# Altium schematic symbol library IC_TI.SCHLIB: 1162 symbols (part 5 of 8) (continued)
## SN74HC377DW
designator U?
Integrated Circuit; Manufacturer_Name: Texas Instruments; Manufacturer_Part_Number: SN74HC377DW; Datasheet Link: http://www.ti.com/lit/ds/symlink/sn74hc377.pdf; Height: 2.65mm; Mouser Part Number: 595-SN74HC377DW; Mouser Price/Stock: https://www.mouser.com/Search/ProductDetail.aspx?qs=5h8QSfodyRiIk4tvBRkKnA%3d%3d; RS Part Number: 6632094; RS Price/Stock: http://uk.rs-online.com/web/p/flip-flop-ics/6632094/?source=DS
footprint SOIC20W_1.27
pins: 1 ~{CLKEN} (in), 2 1Q (out), 3 1D (in), 4 2D (in), 5 2Q (out), 6 3Q (out), 7 3D (in), 8 4D (in), 9 4Q (out), 10 GND (power), 11 CLK (in), 12 5Q (out), 13 5D (in), 14 6D (in), 15 6Q (out), 16 7Q (out), 17 7D (in), 18 8D (in), 19 8Q (out), 20 VCC (power)

## SN74HC377N
designator U?
Integrated Circuit; Manufacturer_Name: Texas Instruments; Manufacturer_Part_Number: SN74HC377N; Datasheet Link: http://www.ti.com/lit/gpn/sn74hc377; Mouser Part Number: 595-SN74HC377N; Mouser Price/Stock: https://www.mouser.com/Search/Refine.aspx?Keyword=595-SN74HC377N; RS Part Number: 3333195; RS Price/Stock: http://uk.rs-online.com/web/p/products/3333195
footprint DIP20
pins: 1 ~CLKEN, 2 1Q, 3 1D, 4 2D, 5 2Q, 6 3Q, 7 3D, 8 4D, 9 4Q, 10 GND, 11 CLK, 12 5Q, 13 5D, 14 6D, 15 6Q, 16 7Q, 17 7D, 18 8D, 19 8Q, 20 VCC

## SN74HC393D
designator U?
Integrated Circuit; Manufacturer_Name: Texas Instruments; Manufacturer_Part_Number: SN74HC393D; Datasheet Link: http://www.ti.com/lit/ds/symlink/sn74hc393.pdf; Height: 1.75mm; Mouser Part Number: 595-SN74HC393D; Mouser Price/Stock: https://www.mouser.com/Search/Refine.aspx?Keyword=595-SN74HC393D; RS Part Number: 1450173; RS Price/Stock: http://uk.rs-online.com/web/p/products/1450173
footprint SOIC14_1.27
pins: 1 1CLK (in), 2 1CLR, 3 1QA, 4 1QB, 5 1QC, 6 1QD, 7 GND (power), 8 2QD, 9 2QC, 10 2QB, 11 2QA, 12 2CLR, 13 2CLK (in), 14 VCC (power)

## SN74HC393NE4
designator U?
Integrated Circuit; Manufacturer_Name: Texas Instruments; Manufacturer_Part_Number: SN74HC393NE4; Datasheet Link: http://www.ti.com/lit/ds/scls143d/scls143d.pdf; Height: 5.08mm; Mouser Part Number: 595-SN74HC393NE4; Mouser Price/Stock: https://www.mouser.com/Search/ProductDetail.aspx?qs=AgY10sKTvDJsJVsODo2UiQ%3d%3d; RS Part Number: 7092012; RS Price/Stock: http://uk.rs-online.com/web/p/products/7092012
footprint DIP14-A
pins: 1 1CLK, 2 1CLR, 3 1QA, 4 1QB, 5 1QC, 6 1QD, 7 GND, 8 2QD, 9 2QC, 10 2QB, 11 2QA, 12 2CLR, 13 2CLK, 14 VCC

## SN74HC393PW
designator U?
Integrated Circuit; Manufacturer_Name: Texas Instruments; Manufacturer_Part_Number: SN74HC393PW; Mouser Part Number: 595-SN74HC393PW
footprint TSSOP14_0.65 (TSOP, 14-Leads, Body 5.00x4.40mm, Pitch 0.65mm, Thermal Pad 2.31x2.46mm, IPC Low Density)
pins: 1 1CLK, 2 1CLR, 3 1QA, 4 1QB, 5 1QC, 6 1QD, 7 GND, 8 2QD, 9 2QC, 10 2QB, 11 2QA, 12 2CLR, 13 2CLK, 14 VCC

## SN74HC541DWR
designator U?
Integrated Circuit; Manufacturer_Name: Texas Instruments; Manufacturer_Part_Number: SN74HC541DWR; Datasheet Link: http://www.ti.com/lit/ds/symlink/sn74hc541.pdf; Height: 2.65mm; Mouser Part Number: 595-SN74HC541DWR; Mouser Price/Stock: https://www.mouser.com/Search/Refine.aspx?Keyword=595-SN74HC541DWR; RS Part Number: 0528533; RS Price/Stock: http://uk.rs-online.com/web/p/products/0528533
footprint SOIC20W_1.27
pins: 1 ~{OE1}, 2 A1, 3 A2, 4 A3, 5 A4, 6 A5, 7 A6, 8 A7, 9 A8, 10 GND (power), 11 Y8, 12 Y7, 13 Y6, 14 Y5, 15 Y4, 16 Y3, 17 Y2, 18 Y1, 19 ~{OE2}, 20 VCC (power)

## SN74HC541NSR
designator U?
Integrated Circuit; Manufacturer_Name: Texas Instruments; Manufacturer_Part_Number: SN74HC541NSR; Datasheet Link: http://www.ti.com/lit/gpn/sn74hc541; Height: 2mm; Mouser Part Number: 595-SN74HC541NSR; Mouser Price/Stock: https://www.mouser.com/Search/Refine.aspx?Keyword=595-SN74HC541NSR
footprint SOP20W_1.27
pins: 1 ~{OE1}, 2 A1, 3 A2, 4 A3, 5 A4, 6 A5, 7 A6, 8 A7, 9 A8, 10 GND, 11 Y8, 12 Y7, 13 Y6, 14 Y5, 15 Y4, 16 Y3, 17 Y2, 18 Y1, 19 ~{OE2}, 20 VCC

## SN74HC541PWR
designator U?
Integrated Circuit; Manufacturer_Name: Texas Instruments; Manufacturer_Part_Number: SN74HC541PWR; Datasheet Link: http://www.ti.com/lit/gpn/sn74hc541; Height: 1.2mm; Mouser Part Number: 595-SN74HC541PWR; Mouser Price/Stock: https://www.mouser.com/Search/Refine.aspx?Keyword=595-SN74HC541PWR; RS Part Number: 1624289; RS Price/Stock: http://uk.rs-online.com/web/p/products/1624289
footprint TSSOP20_0.65 (TSOP, 20-Leads, Body 6.6x4.5mm (max), Pitch 0.65mm, IPC Medium Density)
pins: 1 ~{OE1}, 2 A1, 3 A2, 4 A3, 5 A4, 6 A5, 7 A6, 8 A7, 9 A8, 10 GND, 11 Y8, 12 Y7, 13 Y6, 14 Y5, 15 Y4, 16 Y3, 17 Y2, 18 Y1, 19 ~{OE2}, 20 VCC

## SN74HC573ADW
designator U?
Integrated Circuit; Manufacturer_Name: Texas Instruments; Manufacturer_Part_Number: SN74HC573ADW; Datasheet Link: http://www.ti.com/lit/gpn/sn74hc573a; Mouser Part Number: 595-SN74HC573ADW; Mouser Price/Stock: https://www.mouser.com/Search/Refine.aspx?Keyword=595-SN74HC573ADW; RS Part Number: 6632133P; RS Price/Stock: http://uk.rs-online.com/web/p/products/6632133P
footprint SOIC20W_1.27
pins: 1 ~OE, 2 1D, 3 2D, 4 3D, 5 4D, 6 5D, 7 6D, 8 7D, 9 8D, 10 GND, 11 LE, 12 8Q, 13 7Q, 14 6Q, 15 5Q, 16 4Q, 17 3Q, 18 2Q, 19 1Q, 20 VCC

## SN74HC574DWRG4
designator U?
Integrated Circuit; Manufacturer_Name: Texas Instruments; Manufacturer_Part_Number: SN74HC574DWRG4; Datasheet Link: http://docs-emea.rs-online.com/webdocs/0b83/0900766b80b83bcf.pdf; Height: 2.65mm; RS Part Number: 0526280; RS Price/Stock: http://uk.rs-online.com/web/p/products/0526280
footprint SOIC20W_1.27
pins: 1 ~{OE}, 2 1D, 3 2D, 4 3D, 5 4D, 6 5D, 7 6D, 8 7D, 9 8D, 10 GND (power), 11 CLK (in), 12 8Q, 13 7Q, 14 6Q, 15 5Q, 16 4Q, 17 3Q, 18 2Q, 19 1Q, 20 VCC (power)

## SN74HC594D
designator U?
Integrated Circuit; Manufacturer_Name: Texas Instruments; Manufacturer_Part_Number: SN74HC594D; Datasheet Link: http://www.ti.com/lit/ds/symlink/sn74hc594.pdf; Height: 1.75mm; Mouser Part Number: 595-SN74HC594D; Mouser Price/Stock: https://www.mouser.com/Search/Refine.aspx?Keyword=595-SN74HC594D; RS Part Number: 6632158P; RS Price/Stock: http://uk.rs-online.com/web/p/products/6632158P
footprint SOIC16_1.27
pins: 1 QB, 2 QC, 3 QD, 4 QE, 5 QF, 6 QG, 7 QH, 8 GND (power), 9 QHINVERTED (in), 10 ~{SRCLR}, 11 SRCLR, 12 RCLK (in), 13 ~{RCLK} (in), 14 SER, 15 QA, 16 VCC (power)

## SN74HC594DW
designator U?
Integrated Circuit; Manufacturer_Name: Texas Instruments; Manufacturer_Part_Number: SN74HC594DW; Datasheet Link: http://www.ti.com/lit/gpn/sn74hc594; Mouser Part Number: 595-SN74HC594DW; Mouser Price/Stock: https://www.mouser.com/Search/Refine.aspx?Keyword=595-SN74HC594DW; RS Part Number: 6632151P; RS Price/Stock: http://uk.rs-online.com/web/p/products/6632151P
footprint SOIC16W_1.27
pins: 1 QB, 2 QC, 3 QD, 4 QE, 5 QF, 6 QG, 7 QH, 8 GND, 9 QH_2, 10 ~SRCLR, 11 SRCLK, 12 RCLK, 13 ~RCLR, 14 SER, 15 QA, 16 VCC

## SN74HC594N
designator U?
Integrated Circuit; Manufacturer_Name: Texas Instruments; Manufacturer_Part_Number: SN74HC594N; Datasheet Link: http://www.ti.com/lit/gpn/sn74hc594; Mouser Part Number: 595-SN74HC594N; Mouser Price/Stock: https://www.mouser.com/Search/Refine.aspx?Keyword=595-SN74HC594N; RS Part Number: 0527423; RS Price/Stock: http://uk.rs-online.com/web/p/products/0527423
footprint DIP16
pins: 1 QB, 2 QC, 3 QD, 4 QE, 5 QF, 6 QG, 7 QH, 8 GND, 9 QH_2, 10 ~SRCLR, 11 SRCLK, 12 RCLK, 13 ~RCLR, 14 SER, 15 QA, 16 VCC

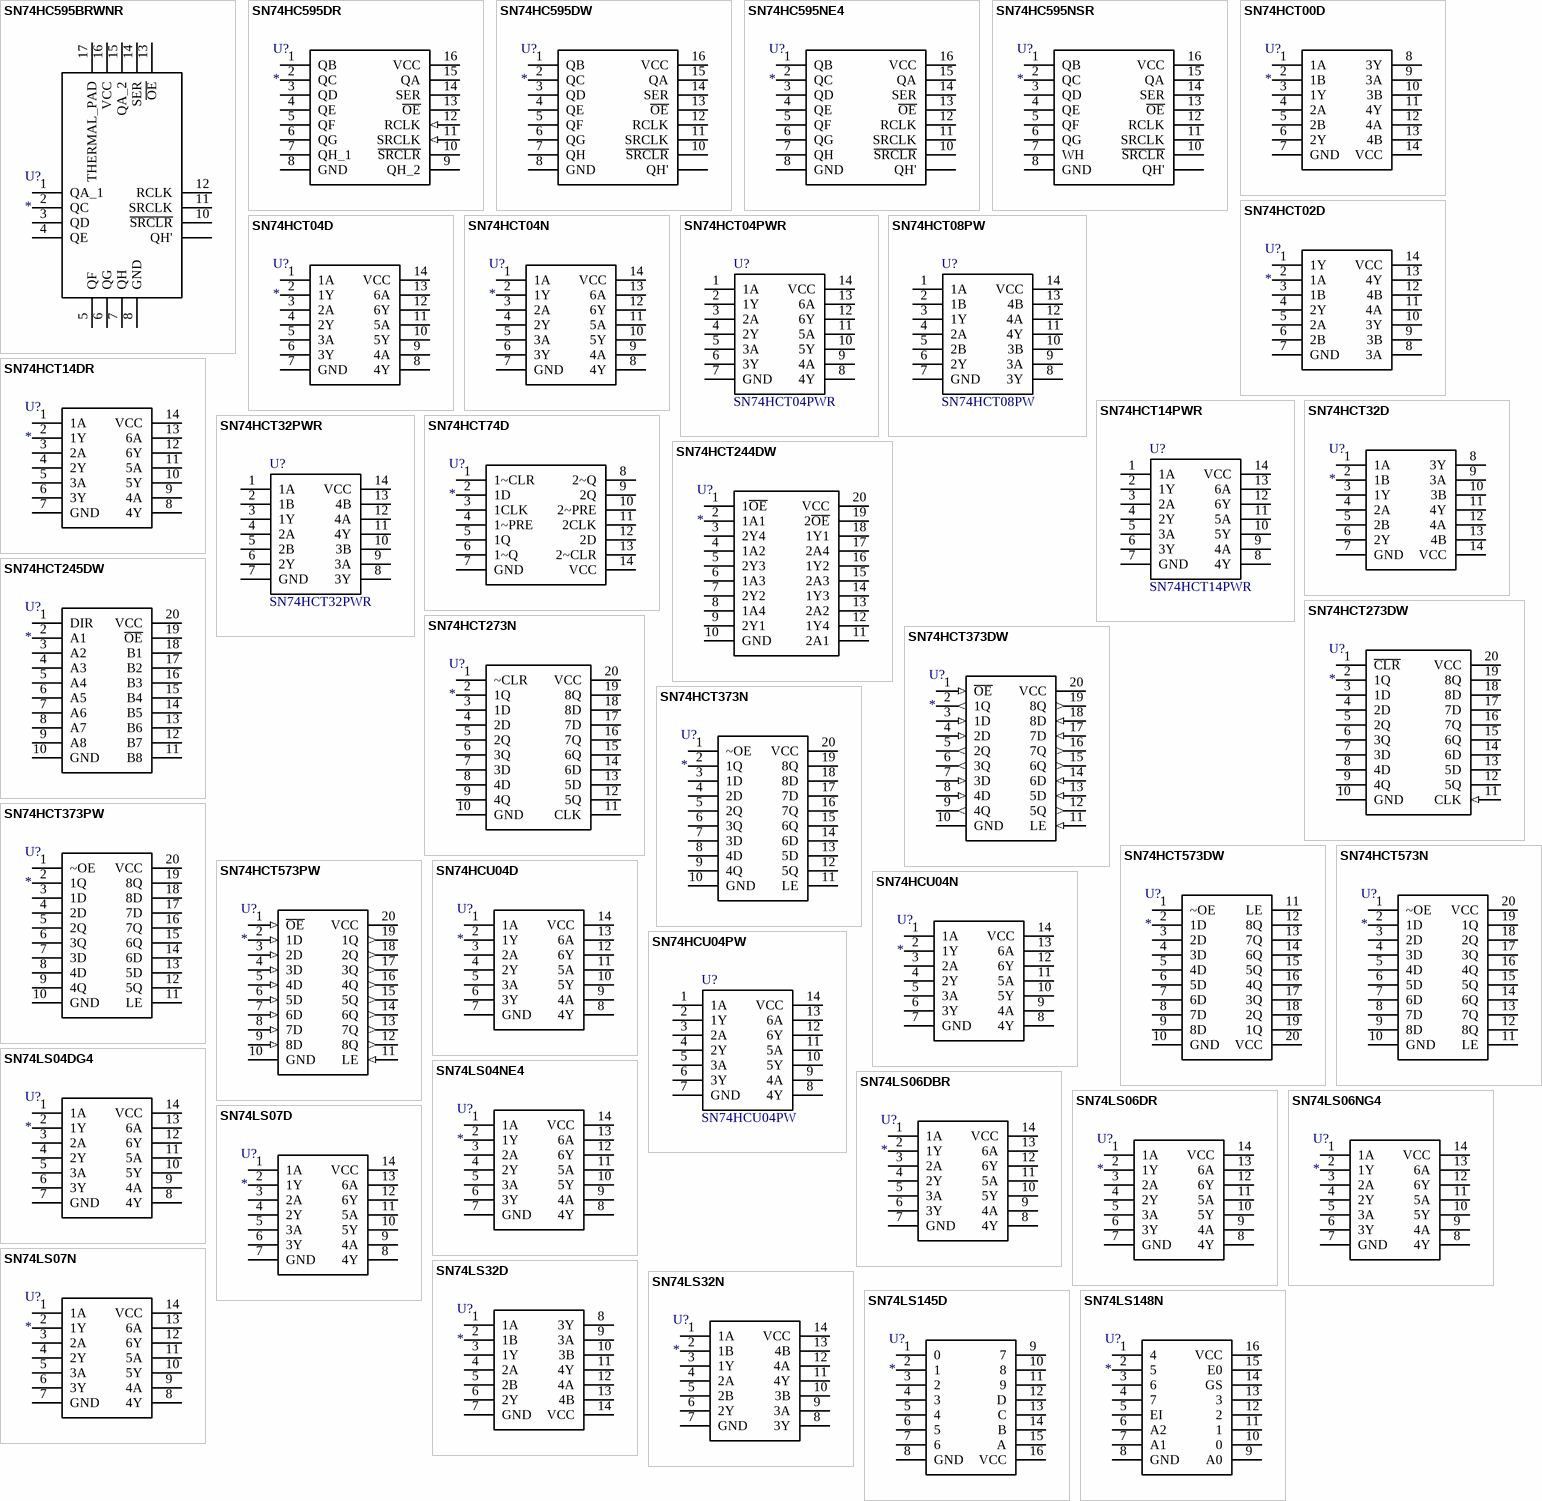
[diagram p22: symbols SN74HC595BRWNR to SN74LS148N]

## SN74HC595BRWNR
designator U?
Integrated Circuit; Manufacturer_Name: Texas Instruments; Manufacturer_Part_Number: SN74HC595BRWNR; Datasheet Link: http://www.ti.com/general/docs/lit/getliterature.tsp?genericPartNumber=SN74HC595B&&fileType=pdf; Height: 0.5mm; Mouser Part Number: 595-SN74HC595BRWNR; Mouser Price/Stock: https://www.mouser.com/Search/Refine.aspx?Keyword=595-SN74HC595BRWNR; RS Part Number: 1330703P; RS Price/Stock: http://uk.rs-online.com/web/p/products/1330703P
footprint QFN16_0.4(2.5X2.5)
pins: 1 QA_1, 2 QC, 3 QD, 4 QE, 5 QF, 6 QG, 7 QH, 8 GND, 10 ~{SRCLR}, 11 SRCLK, 12 RCLK, 13 ~{OE}, 14 SER, 15 QA_2, 16 VCC, 17 THERMAL_PAD, ?1 QH'

## SN74HC595DR
designator U?
Integrated Circuit; Manufacturer_Name: Texas Instruments; Manufacturer_Part_Number: SN74HC595DR; Datasheet Link: http://www.ti.com/lit/ds/symlink/sn74hc595.pdf; Height: 1.75mm; Mouser Part Number: 595-SN74HC595DR; Mouser Price/Stock: https://www.mouser.com/Search/Refine.aspx?Keyword=595-SN74HC595DR; RS Part Number: 1218427; RS Price/Stock: http://uk.rs-online.com/web/p/products/1218427
footprint SOIC16_1.27
pins: 1 QB, 2 QC, 3 QD, 4 QE, 5 QF, 6 QG, 7 QH_1, 8 GND (power), 9 QH_2, 10 ~{SRCLR}, 11 SRCLK (in), 12 RCLK (in), 13 ~{OE}, 14 SER, 15 QA, 16 VCC (power)

## SN74HC595DW
designator U?
Integrated Circuit; Manufacturer_Name: Texas Instruments; Manufacturer_Part_Number: SN74HC595DW; Datasheet Link: https://componentsearchengine.com/Datasheets/2/SN74HC595DW.pdf; Height: 2.65mm; Mouser Part Number: 595-SN74HC595DW; Mouser Price/Stock: https://www.mouser.com/Search/Refine.aspx?Keyword=595-SN74HC595DW; RS Part Number: 1449983; RS Price/Stock: http://uk.rs-online.com/web/p/products/1449983
footprint SOIC16W_1.27
pins: 1 QB, 2 QC, 3 QD, 4 QE, 5 QF, 6 QG, 7 QH, 8 GND, 10 ~{SRCLR}, 11 SRCLK, 12 RCLK, 13 ~{OE}, 14 SER, 15 QA, 16 VCC, ?1 QH'

## SN74HC595NE4
designator U?
Integrated Circuit; Manufacturer_Name: Texas Instruments; Manufacturer_Part_Number: SN74HC595NE4; Datasheet Link: http://www.ti.com/lit/ds/symlink/sn74hc595.pdf; Height: 5.08mm; Mouser Part Number: 595-SN74HC595NE4; Mouser Price/Stock: https://www.mouser.com/Search/Refine.aspx?Keyword=595-SN74HC595NE4
footprint DIP16-A
pins: 1 QB, 2 QC, 3 QD, 4 QE, 5 QF, 6 QG, 7 QH, 8 GND, 10 ~{SRCLR}, 11 SRCLK, 12 RCLK, 13 ~{OE}, 14 SER, 15 QA, 16 VCC, ?1 QH'

## SN74HC595NSR
designator U?
Integrated Circuit; Manufacturer_Name: Texas Instruments; Manufacturer_Part_Number: SN74HC595NSR; Datasheet Link: http://www.ti.com/lit/gpn/sn74hc595; Height: 2mm; Mouser Part Number: 595-SN74HC595NSR; Mouser Price/Stock: https://www.mouser.com/Search/Refine.aspx?Keyword=595-SN74HC595NSR
footprint SOP16W_1.27
pins: 1 QB, 2 QC, 3 QD, 4 QE, 5 QF, 6 QG, 7 WH, 8 GND, 10 ~{SRCLR}, 11 SRCLK, 12 RCLK, 13 ~{OE}, 14 SER, 15 QA, 16 VCC, ?1 QH'

## SN74HCT00D
designator U?
Integrated Circuit; Manufacturer_Name: Texas Instruments; Manufacturer_Part_Number: SN74HCT00D; Datasheet Link: http://www.ti.com/lit/gpn/sn74hct00; Mouser Part Number: 595-SN74HCT00D; Mouser Price/Stock: https://www.mouser.com/Search/Refine.aspx?Keyword=595-SN74HCT00D; RS Part Number: 1792203; RS Price/Stock: http://uk.rs-online.com/web/p/products/1792203
footprint SOIC14_1.27
pins: 1 1A, 2 1B, 3 1Y, 4 2A, 5 2B, 6 2Y, 7 GND, 8 3Y, 9 3A, 10 3B, 11 4Y, 12 4A, 13 4B, 14 VCC

## SN74HCT02D
designator U?
Integrated Circuit; Manufacturer_Name: Texas Instruments; Manufacturer_Part_Number: SN74HCT02D; Datasheet Link: http://docs-emea.rs-online.com/webdocs/0b83/0900766b80b83e92.pdf; Height: 1.75mm; Mouser Part Number: 595-SN74HCT02D; Mouser Price/Stock: https://www.mouser.com/Search/Refine.aspx?Keyword=595-SN74HCT02D; RS Part Number: 0528438; RS Price/Stock: http://uk.rs-online.com/web/p/products/0528438
footprint SOIC14_1.27
pins: 1 1Y, 2 1A, 3 1B, 4 2Y, 5 2A, 6 2B, 7 GND (power), 8 3A, 9 3B, 10 3Y, 11 4A, 12 4B, 13 4Y, 14 VCC (power)

## SN74HCT04D
designator U?
Integrated Circuit; Manufacturer_Name: Texas Instruments; Manufacturer_Part_Number: SN74HCT04D; Datasheet Link: http://www.ti.com/lit/ds/symlink/sn74hct04.pdf; Height: 1.75mm; Mouser Part Number: 595-SN74HCT04D; Mouser Price/Stock: https://www.mouser.com/Search/Refine.aspx?Keyword=595-SN74HCT04D; RS Part Number: 6632243P; RS Price/Stock: http://uk.rs-online.com/web/p/products/6632243P
footprint SOIC14_1.27
pins: 1 1A, 2 1Y, 3 2A, 4 2Y, 5 3A, 6 3Y, 7 GND (power), 8 4Y, 9 4A, 10 5Y, 11 5A, 12 6Y, 13 6A, 14 VCC (power)

## SN74HCT04N
designator U?
Integrated Circuit; Manufacturer_Name: Texas Instruments; Manufacturer_Part_Number: SN74HCT04N; Datasheet Link: http://www.ti.com/lit/gpn/sn74hct04; Mouser Part Number: 595-SN74HCT04N; Mouser Price/Stock: https://www.mouser.com/Search/Refine.aspx?Keyword=595-SN74HCT04N; RS Part Number: 2175718; RS Price/Stock: http://uk.rs-online.com/web/p/products/2175718
footprint DIP14
pins: 1 1A, 2 1Y, 3 2A, 4 2Y, 5 3A, 6 3Y, 7 GND, 8 4Y, 9 4A, 10 5Y, 11 5A, 12 6Y, 13 6A, 14 VCC

## SN74HCT04PWR
designator U?
Integrated Circuit; Manufacturer_Name: Texas Instruments; Datasheet Link: http://www.ti.com/lit/gpn/sn74hct04; Height: 1.2mm; Manufacturer_Part_Number: SN74HCT04PWR; Mouser Part Number: 595-SN74HCT04PWR; Mouser Price/Stock: https://www.mouser.com/Search/Refine.aspx?Keyword=595-SN74HCT04PWR
footprint TSSOP14_0.65 (TSOP, 14-Leads, Body 5.00x4.40mm, Pitch 0.65mm, Thermal Pad 2.31x2.46mm, IPC Low Density)
pins: 1 1A, 2 1Y, 3 2A, 4 2Y, 5 3A, 6 3Y, 7 GND, 8 4Y, 9 4A, 10 5Y, 11 5A, 12 6Y, 13 6A, 14 VCC

## SN74HCT08PW
designator U?
Integrated Circuit; Manufacturer_Name: Texas Instruments; Manufacturer_Part_Number: SN74HCT08PW; Mouser Part Number: 595-SN74HCT08PW; Mouser Price/Stock: https://www.mouser.com/Search/Refine.aspx?Keyword=595-SN74HCT08PW; RS Part Number: 1450457; RS Price/Stock: http://uk.rs-online.com/web/p/products/1450457
footprint TSSOP14_0.65 (TSOP, 14-Leads, Body 5.00x4.40mm, Pitch 0.65mm, Thermal Pad 2.31x2.46mm, IPC Low Density)
pins: 1 1A, 2 1B, 3 1Y, 4 2A, 5 2B, 6 2Y, 7 GND, 8 3Y, 9 3A, 10 3B, 11 4Y, 12 4A, 13 4B, 14 VCC

## SN74HCT14DR
designator U?
Integrated Circuit; Manufacturer_Name: Texas Instruments; Manufacturer_Part_Number: SN74HCT14DR; Datasheet Link: http://www.ti.com/lit/ds/symlink/sn74hct14.pdf; Height: 1.75mm; Mouser Part Number: 595-SN74HCT14DR; Mouser Price/Stock: https://www.mouser.com/Search/Refine.aspx?Keyword=595-SN74HCT14DR; RS Part Number: 0528050; RS Price/Stock: http://uk.rs-online.com/web/p/products/0528050
footprint SOIC14_1.27
pins: 1 1A, 2 1Y, 3 2A, 4 2Y, 5 3A, 6 3Y, 7 GND (power), 8 4Y, 9 4A, 10 5Y, 11 5A, 12 6Y, 13 6A, 14 VCC (power)

## SN74HCT14PWR
designator U?
Integrated Circuit; Manufacturer_Name: Texas Instruments; Datasheet Link: http://componentsearchengine.com/Datasheets/3/SN74HCT14PWR.pdf; Manufacturer_Part_Number: SN74HCT14PWR; Mouser Part Number: 595-SN74HCT14PWR; Mouser Price/Stock: https://www.mouser.com/Search/Refine.aspx?Keyword=595-SN74HCT14PWR; RS Part Number: 1627400; RS Price/Stock: http://uk.rs-online.com/web/p/products/1627400
footprint TSSOP14_0.65 (TSOP, 14-Leads, Body 5.00x4.40mm, Pitch 0.65mm, Thermal Pad 2.31x2.46mm, IPC Low Density)
pins: 1 1A, 2 1Y, 3 2A, 4 2Y, 5 3A, 6 3Y, 7 GND, 8 4Y, 9 4A, 10 5Y, 11 5A, 12 6Y, 13 6A, 14 VCC

## SN74HCT32D
designator U?
Integrated Circuit; Manufacturer_Name: Texas Instruments; Manufacturer_Part_Number: SN74HCT32D; Datasheet Link: http://www.ti.com/lit/gpn/sn74hct32; Mouser Part Number: 595-SN74HCT32D; Mouser Price/Stock: https://www.mouser.com/Search/Refine.aspx?Keyword=595-SN74HCT32D; RS Part Number: 2508245649; RS Price/Stock: http://uk.rs-online.com/web/p/products/2508245649
footprint SOIC14_1.27
pins: 1 1A, 2 1B, 3 1Y, 4 2A, 5 2B, 6 2Y, 7 GND, 8 3Y, 9 3A, 10 3B, 11 4Y, 12 4A, 13 4B, 14 VCC

## SN74HCT32PWR
designator U?
Integrated Circuit; Manufacturer_Name: Texas Instruments; Datasheet Link: http://www.ti.com/lit/gpn/sn74hct32; Height: 1.2mm; Manufacturer_Part_Number: SN74HCT32PWR; Mouser Part Number: 595-SN74HCT32PWR; Mouser Price/Stock: https://www.mouser.com/Search/Refine.aspx?Keyword=595-SN74HCT32PWR; RS Part Number: 1627402; RS Price/Stock: http://uk.rs-online.com/web/p/products/1627402
footprint TSSOP14_0.65 (TSOP, 14-Leads, Body 5.00x4.40mm, Pitch 0.65mm, Thermal Pad 2.31x2.46mm, IPC Low Density)
pins: 1 1A, 2 1B, 3 1Y, 4 2A, 5 2B, 6 2Y, 7 GND, 8 3Y, 9 3A, 10 3B, 11 4Y, 12 4A, 13 4B, 14 VCC

## SN74HCT74D
designator U?
Integrated Circuit; Manufacturer_Name: Texas Instruments; Manufacturer_Part_Number: SN74HCT74D; Datasheet Link: http://www.ti.com/lit/gpn/sn74hct74; Mouser Part Number: 595-SN74HCT74D; Mouser Price/Stock: https://www.mouser.com/Search/Refine.aspx?Keyword=595-SN74HCT74D
footprint SOIC14_1.27
pins: 1 1~CLR, 2 1D, 3 1CLK, 4 1~PRE, 5 1Q, 6 1~Q, 7 GND, 8 2~Q, 9 2Q, 10 2~PRE, 11 2CLK, 12 2D, 13 2~CLR, 14 VCC

## SN74HCT244DW
designator U?
Integrated Circuit; Manufacturer_Name: Texas Instruments; Manufacturer_Part_Number: SN74HCT244DW; Datasheet Link: http://www.ti.com/lit/ds/symlink/sn74hct244.pdf; Height: 2.65mm; Mouser Part Number: 595-SN74HCT244DW; Mouser Price/Stock: https://www.mouser.com/Search/Refine.aspx?Keyword=595-SN74HCT244DW; RS Part Number: 2508245554; RS Price/Stock: http://uk.rs-online.com/web/p/products/2508245554
footprint SOIC20W_1.27
pins: 1 1~{OE}, 2 1A1, 3 2Y4, 4 1A2, 5 2Y3, 6 1A3, 7 2Y2, 8 1A4, 9 2Y1, 10 GND (power), 11 2A1, 12 1Y4, 13 2A2, 14 1Y3, 15 2A3, 16 1Y2, 17 2A4, 18 1Y1, 19 2~{OE}, 20 VCC (power)

## SN74HCT245DW
designator U?
Integrated Circuit; Manufacturer_Name: Texas Instruments; Manufacturer_Part_Number: SN74HCT245DW; Datasheet Link: http://www.ti.com/lit/ds/symlink/sn74hct245.pdf; Height: 2.65mm; Mouser Part Number: 595-SN74HCT245DW; Mouser Price/Stock: https://www.mouser.com/Search/Refine.aspx?Keyword=595-SN74HCT245DW; RS Part Number: 6632278P; RS Price/Stock: http://uk.rs-online.com/web/p/products/6632278P
footprint SOIC20W_1.27
pins: 1 DIR, 2 A1, 3 A2, 4 A3, 5 A4, 6 A5, 7 A6, 8 A7, 9 A8, 10 GND (power), 11 B8, 12 B7, 13 B6, 14 B5, 15 B4, 16 B3, 17 B2, 18 B1, 19 ~{OE}, 20 VCC (power)

## SN74HCT273DW
designator U?
Integrated Circuit; Manufacturer_Name: Texas Instruments; Manufacturer_Part_Number: SN74HCT273DW; Datasheet Link: http://www.ti.com/lit/ds/symlink/sn74hct273.pdf; Height: 2.65mm; Mouser Part Number: 595-SN74HCT273DW; Mouser Price/Stock: https://www.mouser.com/Search/Refine.aspx?Keyword=595-SN74HCT273DW; RS Part Number: 6632284P; RS Price/Stock: http://uk.rs-online.com/web/p/products/6632284P
footprint SOIC20W_1.27
pins: 1 ~{CLR}, 2 1Q, 3 1D, 4 2D, 5 2Q, 6 3Q, 7 3D, 8 4D, 9 4Q, 10 GND (power), 11 CLK (in), 12 5Q, 13 5D, 14 6D, 15 6Q, 16 7Q, 17 7D, 18 8D, 19 8Q, 20 VCC (power)

## SN74HCT273N
designator U?
Integrated Circuit; Manufacturer_Name: Texas Instruments; Manufacturer_Part_Number: SN74HCT273N; Datasheet Link: http://www.ti.com/lit/gpn/sn74hct273; Mouser Part Number: 595-SN74HCT273N; Mouser Price/Stock: https://www.mouser.com/Search/Refine.aspx?Keyword=595-SN74HCT273N; RS Part Number: 2508245633; RS Price/Stock: http://uk.rs-online.com/web/p/products/2508245633
footprint DIP20
pins: 1 ~CLR, 2 1Q, 3 1D, 4 2D, 5 2Q, 6 3Q, 7 3D, 8 4D, 9 4Q, 10 GND, 11 CLK, 12 5Q, 13 5D, 14 6D, 15 6Q, 16 7Q, 17 7D, 18 8D, 19 8Q, 20 VCC

## SN74HCT373DW
designator U?
Integrated Circuit; Manufacturer_Name: Texas Instruments; Manufacturer_Part_Number: SN74HCT373DW; Datasheet Link: http://www.ti.com/lit/ds/symlink/sn74hct373.pdf; Height: 2.65mm; Mouser Part Number: 595-SN74HCT373DW; Mouser Price/Stock: https://www.mouser.com/Search/Refine.aspx?Keyword=595-SN74HCT373DW; RS Part Number: 6632296P; RS Price/Stock: http://uk.rs-online.com/web/p/products/6632296P
footprint SOIC20W_1.27
pins: 1 ~{OE} (in), 2 1Q (out), 3 1D (in), 4 2D (in), 5 2Q (out), 6 3Q (out), 7 3D (in), 8 4D (in), 9 4Q (out), 10 GND (power), 11 LE (in), 12 5Q (out), 13 5D (in), 14 6D (in), 15 6Q (out), 16 7Q (out), 17 7D (in), 18 8D (in), 19 8Q (out), 20 VCC (power)

## SN74HCT373N
designator U?
Integrated Circuit; Manufacturer_Name: Texas Instruments; Manufacturer_Part_Number: SN74HCT373N; Datasheet Link: http://www.ti.com/lit/gpn/sn74hct373; Mouser Part Number: 595-SN74HCT373N; Mouser Price/Stock: https://www.mouser.com/Search/Refine.aspx?Keyword=595-SN74HCT373N; RS Part Number: 0526161; RS Price/Stock: http://uk.rs-online.com/web/p/products/0526161
footprint DIP20
pins: 1 ~OE, 2 1Q, 3 1D, 4 2D, 5 2Q, 6 3Q, 7 3D, 8 4D, 9 4Q, 10 GND, 11 LE, 12 5Q, 13 5D, 14 6D, 15 6Q, 16 7Q, 17 7D, 18 8D, 19 8Q, 20 VCC

## SN74HCT373PW
designator U?
Integrated Circuit; Manufacturer_Name: Texas Instruments; Manufacturer_Part_Number: SN74HCT373PW; Mouser Part Number: 595-SN74HCT373PW; Mouser Price/Stock: https://www.mouser.com/Search/Refine.aspx?Keyword=595-SN74HCT373PW; RS Part Number: 1450459; RS Price/Stock: http://uk.rs-online.com/web/p/products/1450459
footprint TSSOP20_0.65 (TSOP, 20-Leads, Body 6.6x4.5mm (max), Pitch 0.65mm, IPC Medium Density)
pins: 1 ~OE, 2 1Q, 3 1D, 4 2D, 5 2Q, 6 3Q, 7 3D, 8 4D, 9 4Q, 10 GND, 11 LE, 12 5Q, 13 5D, 14 6D, 15 6Q, 16 7Q, 17 7D, 18 8D, 19 8Q, 20 VCC

## SN74HCT573DW
designator U?
Integrated Circuit; Manufacturer_Name: Texas Instruments; Manufacturer_Part_Number: SN74HCT573DW; Datasheet Link: http://www.ti.com/lit/gpn/sn74hct573; Mouser Part Number: 595-SN74HCT573DW; Mouser Price/Stock: https://www.mouser.com/Search/Refine.aspx?Keyword=595-SN74HCT573DW; RS Part Number: 0526442; RS Price/Stock: http://uk.rs-online.com/web/p/products/0526442
footprint SOIC20W_1.27
pins: 1 ~OE, 2 1D, 3 2D, 4 3D, 5 4D, 6 5D, 7 6D, 8 7D, 9 8D, 10 GND, 11 LE, 12 8Q, 13 7Q, 14 6Q, 15 5Q, 16 4Q, 17 3Q, 18 2Q, 19 1Q, 20 VCC

## SN74HCT573N
designator U?
Integrated Circuit; Manufacturer_Name: Texas Instruments; Manufacturer_Part_Number: SN74HCT573N; Datasheet Link: http://www.ti.com/lit/gpn/sn74hct573; Mouser Part Number: 595-SN74HCT573N; Mouser Price/Stock: https://www.mouser.com/Search/Refine.aspx?Keyword=595-SN74HCT573N; RS Part Number: 6195952P; RS Price/Stock: http://uk.rs-online.com/web/p/products/6195952P
footprint DIP20
pins: 1 ~OE, 2 1D, 3 2D, 4 3D, 5 4D, 6 5D, 7 6D, 8 7D, 9 8D, 10 GND, 11 LE, 12 8Q, 13 7Q, 14 6Q, 15 5Q, 16 4Q, 17 3Q, 18 2Q, 19 1Q, 20 VCC

## SN74HCT573PW
designator U?
Integrated Circuit; Manufacturer_Name: Texas Instruments; Manufacturer_Part_Number: SN74HCT573PW; Datasheet Link: http://www.ti.com/lit/ds/symlink/sn74hct573.pdf; Height: 1.2mm; Mouser Part Number: 595-SN74HCT573PW; Mouser Price/Stock: https://www.mouser.com/Search/Refine.aspx?Keyword=595-SN74HCT573PW; RS Part Number: 1456138; RS Price/Stock: http://uk.rs-online.com/web/p/products/1456138
footprint TSSOP20_0.65 (TSOP, 20-Leads, Body 6.6x4.5mm (max), Pitch 0.65mm, IPC Medium Density)
pins: 1 ~{OE} (in), 2 1D (in), 3 2D (in), 4 3D (in), 5 4D (in), 6 5D (in), 7 6D (in), 8 7D (in), 9 8D (in), 10 GND (power), 11 LE (in), 12 8Q (out), 13 7Q (out), 14 6Q (out), 15 5Q (out), 16 4Q (out), 17 3Q (out), 18 2Q (out), 19 1Q (out), 20 VCC (power)

## SN74HCU04D
designator U?
Integrated Circuit; Manufacturer_Name: Texas Instruments; Manufacturer_Part_Number: SN74HCU04D; Datasheet Link: http://www.ti.com/lit/ds/symlink/sn74hcu04.pdf; Height: 1.75mm; Mouser Part Number: 595-SN74HCU04D; Mouser Price/Stock: https://www.mouser.com/Search/Refine.aspx?Keyword=595-SN74HCU04D; RS Part Number: 6632341P; RS Price/Stock: http://uk.rs-online.com/web/p/products/6632341P
footprint SOIC14_1.27
pins: 1 1A, 2 1Y, 3 2A, 4 2Y, 5 3A, 6 3Y, 7 GND (power), 8 4Y, 9 4A, 10 5Y, 11 5A, 12 6Y, 13 6A, 14 VCC (power)

## SN74HCU04N
designator U?
Integrated Circuit; Manufacturer_Name: Texas Instruments; Manufacturer_Part_Number: SN74HCU04N; Datasheet Link: http://www.ti.com/lit/gpn/sn74hcu04; Mouser Part Number: 595-SN74HCU04N; Mouser Price/Stock: https://www.mouser.com/Search/Refine.aspx?Keyword=595-SN74HCU04N
footprint DIP14
pins: 1 1A, 2 1Y, 3 2A, 4 2Y, 5 3A, 6 3Y, 7 GND, 8 4Y, 9 4A, 10 5Y, 11 5A, 12 6Y, 13 6A, 14 VCC

## SN74HCU04PW
designator U?
Integrated Circuit; Manufacturer_Name: Texas Instruments; Manufacturer_Part_Number: SN74HCU04PW; Mouser Part Number: 595-SN74HCU04PW; Mouser Price/Stock: https://www.mouser.com/Search/Refine.aspx?Keyword=595-SN74HCU04PW; RS Part Number: 6632350; RS Price/Stock: http://uk.rs-online.com/web/p/products/6632350
footprint TSSOP14_0.65 (TSOP, 14-Leads, Body 5.00x4.40mm, Pitch 0.65mm, Thermal Pad 2.31x2.46mm, IPC Low Density)
pins: 1 1A, 2 1Y, 3 2A, 4 2Y, 5 3A, 6 3Y, 7 GND, 8 4Y, 9 4A, 10 5Y, 11 5A, 12 6Y, 13 6A, 14 VCC

## SN74LS04DG4
designator U?
Integrated Circuit; Manufacturer_Name: Texas Instruments; Manufacturer_Part_Number: SN74LS04DG4; Datasheet Link: http://www.ti.com/lit/ds/symlink/sn74ls04.pdf; Height: 1.75mm; Mouser Part Number: 595-SN74LS04DG4; Mouser Price/Stock: https://www.mouser.com/Search/Refine.aspx?Keyword=595-SN74LS04DG4
footprint SOIC14_1.27
pins: 1 1A, 2 1Y, 3 2A, 4 2Y, 5 3A, 6 3Y, 7 GND, 8 4Y, 9 4A, 10 5Y, 11 5A, 12 6Y, 13 6A, 14 VCC

## SN74LS04NE4
designator U?
Integrated Circuit; Manufacturer_Name: Texas Instruments; Manufacturer_Part_Number: SN74LS04NE4; Datasheet Link: http://www.ti.com/lit/ds/symlink/sn74ls04.pdf; Height: 5.08mm; Mouser Part Number: 595-SN74LS04NE4; Mouser Price/Stock: https://www.mouser.com/Search/Refine.aspx?Keyword=595-SN74LS04NE4
footprint DIP14-A
pins: 1 1A, 2 1Y, 3 2A, 4 2Y, 5 3A, 6 3Y, 7 GND, 8 4Y, 9 4A, 10 5Y, 11 5A, 12 6Y, 13 6A, 14 VCC

## SN74LS06DBR
designator U?
Integrated Circuit; Manufacturer_Name: Texas Instruments; Manufacturer_Part_Number: SN74LS06DBR; Datasheet Link: http://www.ti.com/lit/gpn/sn74ls06; Height: 2mm; Mouser Part Number: 595-SN74LS06DBR; Mouser Price/Stock: https://www.mouser.com/Search/Refine.aspx?Keyword=595-SN74LS06DBR
footprint SSOP14_0.65
pins: 1 1A, 2 1Y, 3 2A, 4 2Y, 5 3A, 6 3Y, 7 GND, 8 4Y, 9 4A, 10 5Y, 11 5A, 12 6Y, 13 6A, 14 VCC

## SN74LS06DR
designator U?
Integrated Circuit; Manufacturer_Name: Texas Instruments; Manufacturer_Part_Number: SN74LS06DR; Datasheet Link: http://www.mouser.com/ds/2/405/sn74ls06-445149.pdf; Height: 1.75mm; Mouser Part Number: 595-SN74LS06DR; Mouser Price/Stock: https://www.mouser.com/Search/Refine.aspx?Keyword=595-SN74LS06DR
footprint SOIC14_1.27
pins: 1 1A, 2 1Y, 3 2A, 4 2Y, 5 3A, 6 3Y, 7 GND, 8 4Y, 9 4A, 10 5Y, 11 5A, 12 6Y, 13 6A, 14 VCC

## SN74LS06NG4
designator U?
Integrated Circuit; Manufacturer_Name: Texas Instruments; Manufacturer_Part_Number: SN74LS06NG4; Datasheet Link: http://www.farnell.com/datasheets/1962917.pdf; Height: 5.08mm
footprint DIP14-A
pins: 1 1A, 2 1Y, 3 2A, 4 2Y, 5 3A, 6 3Y, 7 GND, 8 4Y, 9 4A, 10 5Y, 11 5A, 12 6Y, 13 6A, 14 VCC